# Altium footprint library EV_Components.PcbLib: 10 footprints
Each footprint in its own frame and in the unit in brackets; x right, y up, seen from the top. Pads: shape width x height; smd on the part's side, far side on the other; paste and mask are expansions set on the pad; w line width, h text height; cw(c..) or ccw(c..) is an arc to the next point about the centre after c.
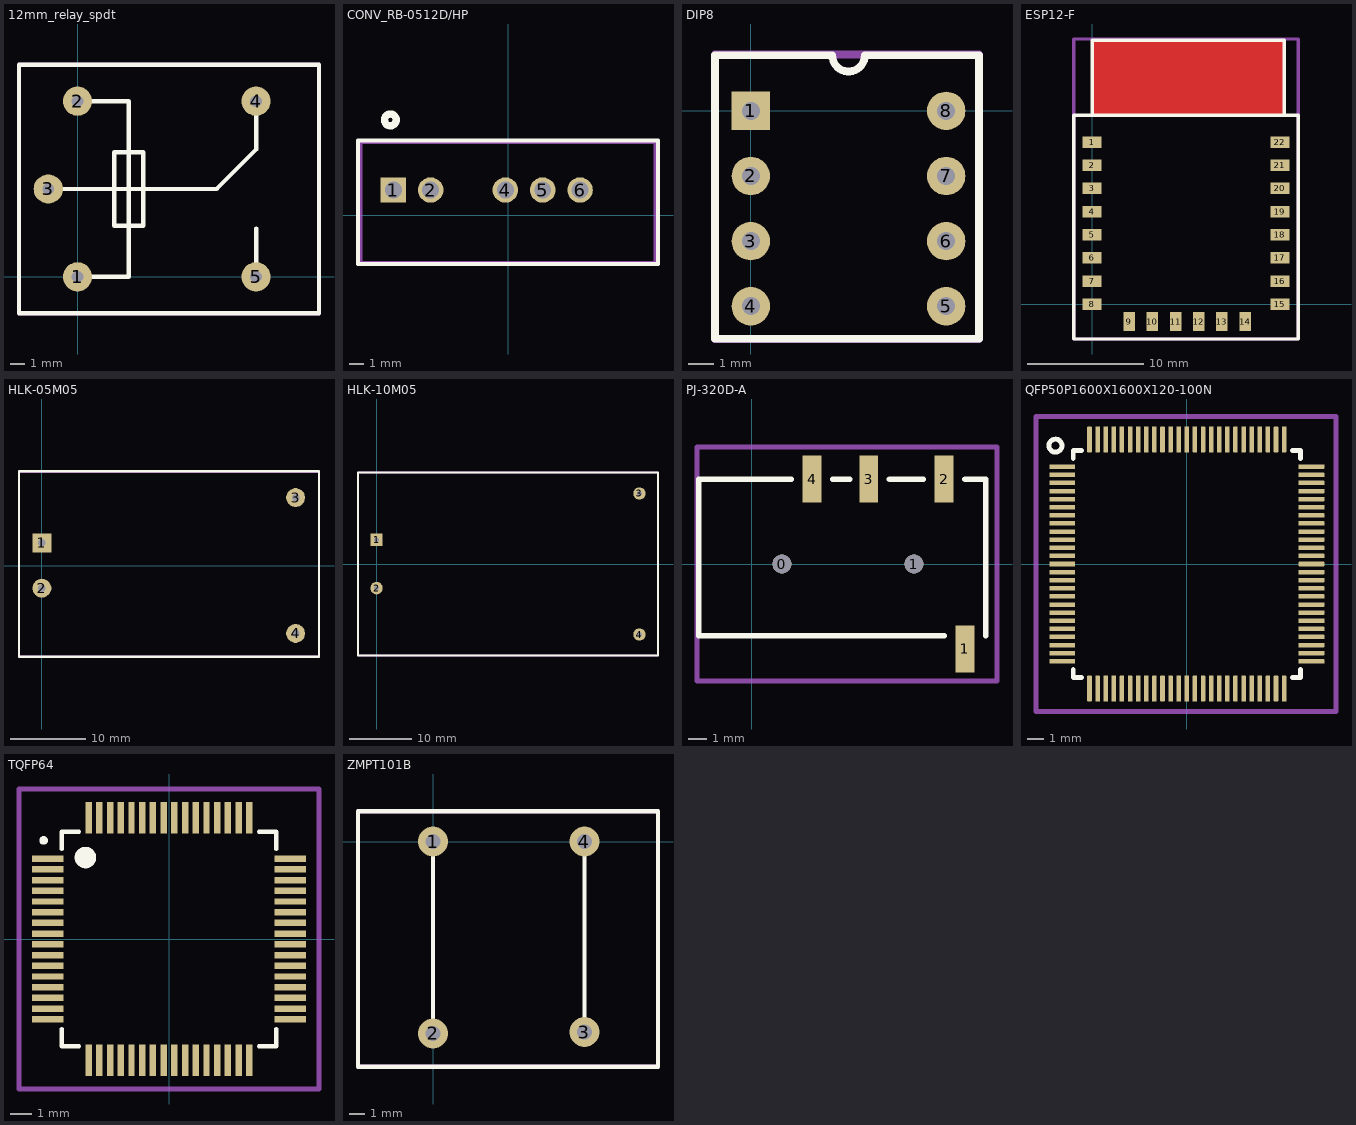
[diagram p0: the footprints below, top view; thin cyan lines are the x and y axes]

## 12mm_relay_spdt [mm]
pads (5):
  round 2 hole 0.8: 1(0,0) 2(0,12) 3(-2,6) 4(12.2,12) 5(12.2,0)
Top Overlay:
  lines w0.3: -2,6 9.5,6 12.2,8.7 12.2,12 ; 0,0 3.5,0 3.5,12 0,12 ; 12.2,0 12.2,3.3 ; -4,-2.5 -4,14.5 16.5,14.5 16.5,-2.5 -4,-2.5 ; 2.5,3.5 2.5,6 2.5,8.5 4.5,8.5 4.5,3.5 2.5,3.5
Mechanical 2:
  lines w0.3: -4,-2.5 -4,14.5 16.5,14.5 16.5,-2.5 -4,-2.5
  text ".Designator" at 0.854,5.662 h1.52
3D body "User Library-relay_songle.STEP": height 15.31, standoff -4.99, extent -3.393,-1.712 15.707,13.788

## CONV_RB-0512D/HP [mm]
pads (5):
  rect 1.73x1.73 hole 1.15: 1(-7.8,1.73)
  round 1.73 hole 1.15: 2(-5.26,1.73) 4(-0.18,1.73) 5(2.36,1.73) 6(4.9,1.73)
Top Overlay:
  circle w0.5: c-8,6.5 r0.4
  lines w0.3: -10.2,-3.3 10.2,-3.3 10.2,5.1 -10.2,5.1 -10.2,-3.3
Mechanical 2:
  lines w0.3: -10.05,-3.25 10.05,-3.25 10.05,5 -10.05,5 -10.05,-3.25
  text ".Designator" at -6.546,0.562 h1.52
3D body "RELAY_A0512S-1WR3_MNS.step": height 10.16, standoff -5.49, extent -9.83,-2 9.83,3.994

## DIP8 [mm]
pads (8):
  rect 1.5x1.5 hole 0.7: 1(0,0)
  round 1.5 hole 0.7: 2(0,-2.54) 3(0,-5.08) 4(0,-7.62) 5(7.62,-7.62) 6(7.62,-5.08) 7(7.62,-2.54) 8(7.62,0)
Top Overlay:
  lines w0.3: -1.4,-8.89 8.9,-8.89 8.9,2.17 4.445,2.17 cw(c3.81,2.17) 3.175,2.17 -1.4,2.17 -1.4,-8.89
Mechanical 2:
  lines w0.3: -1.4,-8.9 -1.4,2.2 8.9,2.2 8.9,-8.9 -1.4,-8.9
  text ".Designator" at 0.154,-3.638 h1.52
3D body "pdip8.stp": height 4.31, standoff -3.71, extent -0.135,-8.88 7.735,1.28

## ESP12-F [mm]
pads (22):
  rect 1.65x1 smd: 1(0,14) 2(0,12) 3(0,10) 4(0,8) 5(0,6) 6(0,4) 7(0,2) 8(0,0) 15(16.2,0) 16(16.2,2) 17(16.2,4) 18(16.2,6) 19(16.2,8) 20(16.2,10) 21(16.2,12) 22(16.2,14)
  rect 1x1.65 smd: 9(3.2,-1.5) 10(5.2,-1.5) 11(7.2,-1.5) 12(9.2,-1.5) 13(11.2,-1.5) 14(13.2,-1.5)
Top Layer:
  pour cut-out: 0,16.3 16.6,16.3 16.6,22.8 0,22.8
Bottom Layer:
  pour cut-out: 0,16.3 16.6,16.3 16.6,22.8 0,22.8
Top Overlay:
  lines w0.3: 0,16.3 0,22.8 16.6,22.8 16.6,16.3 ; 0,16.3 16.6,16.3 ; 0,16.3 -1.6,16.3 -1.6,-3 17.8,-3 17.8,16.3 16.6,16.3
Mechanical 2:
  lines w0.3: -1.6,-3 17.8,-3 17.8,22.9 -1.6,22.9 -1.6,-3
  text ".Designator" at 1.154,8.662 h1.52
3D body "ESP-12F.STEP": height 3.15, standoff -0.02, extent 0.3,-1.5 16.3,22.5

## HLK-05M05 [mm]
pads (4):
  rect 2.5x2.5 hole 1: 1(0,3)
  round 2.5 hole 1: 2(0,-3) 3(33.6,9) 4(33.6,-9)
Top Overlay:
  lines w0.3: -3.033,-12.1 36.7,-12.1 36.7,12.5 -3.033,12.5 -3.033,-12.1
Bottom Overlay:
  text "V-" at 31.046,8.154 h1.52
  text "V+" at 30.646,-9.846 h1.52
Mechanical 2:
  lines w0.3: -3.033,-12.1 36.7,-12.1 36.7,12.4 -3.033,12.4 -3.033,-12.1
  text ".Designator" at 7.321,1.029 h1.52
3D body "User Library-HLK-5M05.step": height 18.01, standoff -4.99, extent -2.2,-11.5 35.8,11.5

## HLK-10M05 [mm]
pads (4):
  rect 2x2 hole 0.8: 1(0,3.9)
  round 2 hole 0.8: 2(0,-3.9) 3(42.5,11.4) 4(42.5,-11.4)
Top Overlay:
  lines w0.3: -3,-14.8 -3,14.8 45.5,14.8 45.5,-14.8 -3,-14.8
Mechanical 2:
  lines w0.3: -3,-14.8 -3,14.8 45.5,14.8 45.5,-14.8 -3,-14.8
  text ".Designator" at 7.354,0.962 h1.52
3D body "HLK-10M05 v6.step": height 18.11, standoff -5, extent -2.311,-13.966 44.589,13.834

## PJ-320D-A [mm]
pads (6):
  round 1 hole 1 unplated: 0(1.6,0) 1(8.6,0)
  rect 1x2.5 smd: 1(11.3,-4.5) 2(10.2,4.5) 3(6.2,4.5) 4(3.2,4.5)
Top Overlay:
  lines w0.3: 2.1,4.5 -2.8,4.5 -2.8,-3.8 10.2,-3.8 ; 4.3,4.5 5.2,4.5 ; 7.3,4.5 9.1,4.5 ; 11.3,4.5 12.4,4.5 12.4,-3.8
Mechanical 2:
  lines w0.254: -2.9,-6.2 13,-6.2 13,6.2 -2.9,6.2 -2.9,-6.2
  text ".Designator" at -1.446,-0.338 h1.52
3D body "PJ320D.STEP": height 5.5, standoff -0.5, extent -2.007,-4.127 11.993,4.152

## QFP50P1600X1600X120-100N [mm]
height 1.2
pads (100):
  rrect25% 1.6x0.28 smd: 1(-7.68,6) 2(-7.68,5.5) 3(-7.68,5) 4(-7.68,4.5) 5(-7.68,4) 6(-7.68,3.5) 7(-7.68,3) 8(-7.68,2.5) 9(-7.68,2) 10(-7.68,1.5) 11(-7.68,1) 12(-7.68,0.5) 13(-7.68,0) 14(-7.68,-0.5) 15(-7.68,-1) 16(-7.68,-1.5) 17(-7.68,-2) 18(-7.68,-2.5) 19(-7.68,-3) 20(-7.68,-3.5) 21(-7.68,-4) 22(-7.68,-4.5) 23(-7.68,-5) 24(-7.68,-5.5) 25(-7.68,-6) 51(7.68,-6) 52(7.68,-5.5) 53(7.68,-5) 54(7.68,-4.5) 55(7.68,-4) 56(7.68,-3.5) 57(7.68,-3) 58(7.68,-2.5) 59(7.68,-2) 60(7.68,-1.5) 61(7.68,-1) 62(7.68,-0.5) 63(7.68,0) 64(7.68,0.5) 65(7.68,1) 66(7.68,1.5) 67(7.68,2) 68(7.68,2.5) 69(7.68,3) 70(7.68,3.5) 71(7.68,4) 72(7.68,4.5) 73(7.68,5) 74(7.68,5.5) 75(7.68,6)
  rrect25% 0.28x1.6 smd: 26(-6,-7.68) 27(-5.5,-7.68) 28(-5,-7.68) 29(-4.5,-7.68) 30(-4,-7.68) 31(-3.5,-7.68) 32(-3,-7.68) 33(-2.5,-7.68) 34(-2,-7.68) 35(-1.5,-7.68) 36(-1,-7.68) 37(-0.5,-7.68) 38(0,-7.68) 39(0.5,-7.68) 40(1,-7.68) 41(1.5,-7.68) 42(2,-7.68) 43(2.5,-7.68) 44(3,-7.68) 45(3.5,-7.68) 46(4,-7.68) 47(4.5,-7.68) 48(5,-7.68) 49(5.5,-7.68) 50(6,-7.68) 76(6,7.68) 77(5.5,7.68) 78(5,7.68) 79(4.5,7.68) 80(4,7.68) 81(3.5,7.68) 82(3,7.68) 83(2.5,7.68) 84(2,7.68) 85(1.5,7.68) 86(1,7.68) 87(0.5,7.68) 88(0,7.68) 89(-0.5,7.68) 90(-1,7.68) 91(-1.5,7.68) 92(-2,7.68) 93(-2.5,7.68) 94(-3,7.68) 95(-3.5,7.68) 96(-4,7.68) 97(-4.5,7.68) 98(-5,7.68) 99(-5.5,7.68) 100(-6,7.68)
Top Overlay:
  circle w0.3: c-8.1,7.3 r0.4
  lines w0.3: -7,-6.5 -7,-7 -6.5,-7 ; -7,6.5 -7,7 -6.5,7 ; 6.5,-7 7,-7 7,-6.5 ; 6.5,7 7,7 7,6.5
Mechanical 2:
  lines w0.3: -9.3,-9.1 -9.3,9.1 9.2,9.1 9.2,-9.1 -9.3,-9.1

## TQFP64 [mm]
pads (64):
  rect 1.47x0.3 smd: 1(-5.67,3.75) 2(-5.67,3.25) 3(-5.67,2.75) 4(-5.67,2.25) 5(-5.67,1.75) 6(-5.67,1.25) 7(-5.67,0.75) 8(-5.67,0.25) 9(-5.67,-0.25) 10(-5.67,-0.75) 11(-5.67,-1.25) 12(-5.67,-1.75) 13(-5.67,-2.25) 14(-5.67,-2.75) 15(-5.67,-3.25) 16(-5.67,-3.75) 33(5.67,-3.75) 34(5.67,-3.25) 35(5.67,-2.75) 36(5.67,-2.25) 37(5.67,-1.75) 38(5.67,-1.25) 39(5.67,-0.75) 40(5.67,-0.25) 41(5.67,0.25) 42(5.67,0.75) 43(5.67,1.25) 44(5.67,1.75) 45(5.67,2.25) 46(5.67,2.75) 47(5.67,3.25) 48(5.67,3.75)
  rect 0.3x1.47 smd: 17(-3.75,-5.67) 18(-3.25,-5.67) 19(-2.75,-5.67) 20(-2.25,-5.67) 21(-1.75,-5.67) 22(-1.25,-5.67) 23(-0.75,-5.67) 24(-0.25,-5.67) 25(0.25,-5.67) 26(0.75,-5.67) 27(1.25,-5.67) 28(1.75,-5.67) 29(2.25,-5.67) 30(2.75,-5.67) 31(3.25,-5.67) 32(3.75,-5.67) 49(3.75,5.67) 50(3.25,5.67) 51(2.75,5.67) 52(2.25,5.67) 53(1.75,5.67) 54(1.25,5.67) 55(0.75,5.67) 56(0.25,5.67) 57(-0.25,5.67) 58(-0.75,5.67) 59(-1.25,5.67) 60(-1.75,5.67) 61(-2.25,5.67) 62(-2.75,5.67) 63(-3.25,5.67) 64(-3.75,5.67)
Top Overlay:
  circle w0.5: c-3.9,3.8 r0.25
  circle w0.2: c-5.85,4.6 r0.1
  lines w0.2: -5,-4.2 -5,-5 -4.2,-5 ; -5,4.2 -5,5 -4.2,5 ; 4.2,-5 5,-5 5,-4.2 ; 4.2,5 5,5 5,4.2
Mechanical 2:
  lines w0.254: -7,-7 7,-7 7,7 -7,7 -7,-7
  text ".Designator" at -2.846,0.062 h1.52
3D body "TQFP64.stp": height 0.77, standoff -0.58, extent -6,-6 6,6

## ZMPT101B [mm]
pads (4):
  round 2 hole 1: 1(0,0) 2(0,-12.8) 3(10.1,-12.7) 4(10.1,0)
Top Overlay:
  lines w0.3: 0,-12.8 0,0 ; 10.1,-12.7 10.1,0 ; -5,-15 -5,2 0,2 15,2 15,-15 -5,-15
Top Solder:
  text ".Designator" at -1.746,-6.238 h1.52
Mechanical 2:
  lines w0.3: -5,-15 15,-15 15,2 0,2 -5,2 -5,-15
3D body "ZMPT101B.STEP": height 18, standoff -4, extent -4.4,-14.4 14.6,1.6